# Altium footprint library 4.49-接插件.PcbLib: 260 footprints (part 11 of 17)
Each footprint in its own frame and in the unit in brackets; x right, y up, seen from the top. Pads: shape width x height; smd on the part's side, far side on the other; paste and mask are expansions set on the pad; w line width, h text height; cw(c..) or ccw(c..) is an arc to the next point about the centre after c.
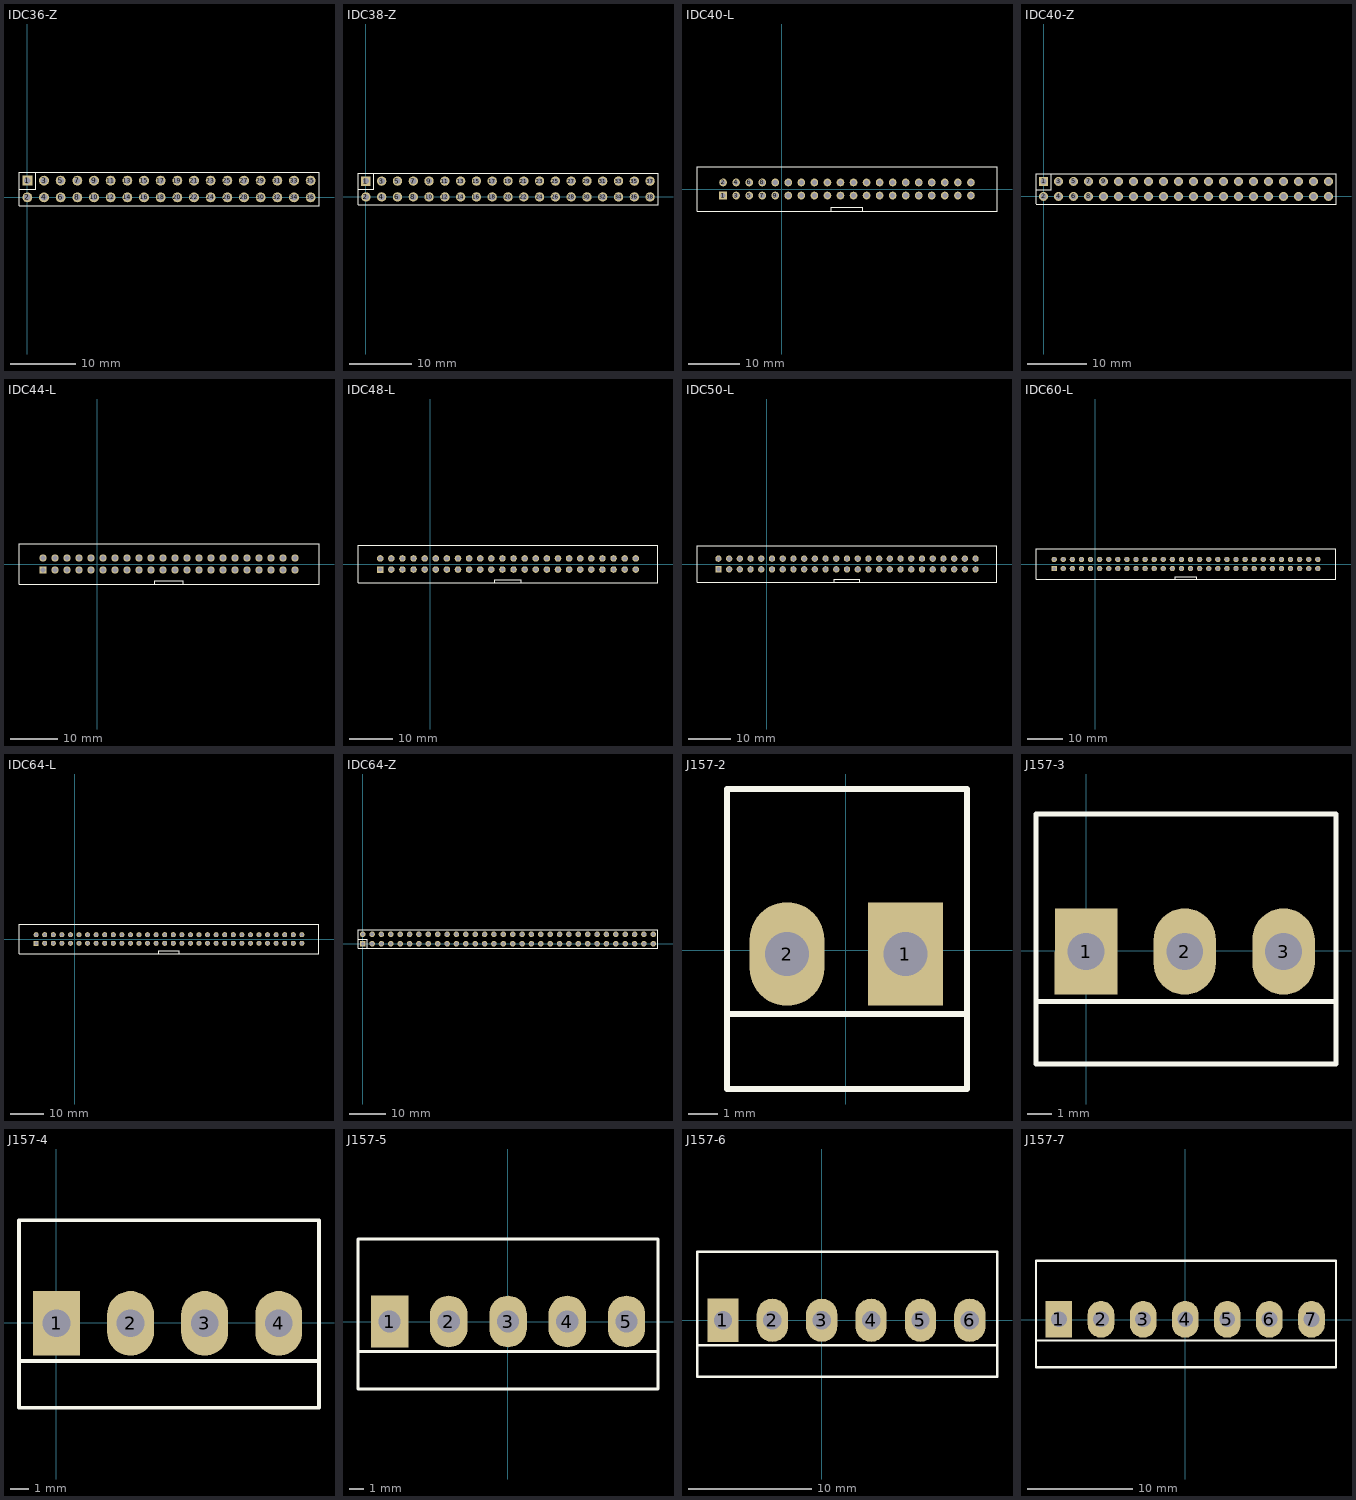
[diagram p10: the footprints below, top view; thin cyan lines are the x and y axes]

## IDC36-Z [mm]
pads (36):
  rect 1.5x1.5 hole 1: 1(0,2.54)
  round 1.5 hole 1: 2(0,0) 3(2.54,2.54) 4(2.54,0) 5(5.08,2.54) 6(5.08,0) 7(7.62,2.54) 8(7.62,0) 9(10.16,2.54) 10(10.16,0) 11(12.7,2.54) 12(12.7,0) 13(15.24,2.54) 14(15.24,0) 15(17.78,2.54) 16(17.78,0) 17(20.32,2.54) 18(20.32,0) 19(22.86,2.54) 20(22.86,0) 21(25.4,2.54) 22(25.4,0) 23(27.94,2.54) 24(27.94,0) 25(30.48,2.54) 26(30.48,0) 27(33.02,2.54) 28(33.02,0) 29(35.56,2.54) 30(35.56,0) 31(38.1,2.54) 32(38.1,0) 33(40.64,2.54) 34(40.64,0) 35(43.18,2.54) 36(43.18,0)
Top Overlay:
  lines w0.15: -1.27,1.27 1.27,1.27 1.27,3.81 ; -1.27,-1.27 44.45,-1.27 44.45,3.81 -1.27,3.81 -1.27,-1.27
3D body: height 8.5, standoff -3.35, extent -1.27,-1.23 44.45,3.77

## IDC38-Z [mm]
pads (38):
  rect 1.5x1.5 hole 1: 1(0,2.54)
  round 1.5 hole 1: 2(0,0) 3(2.54,2.54) 4(2.54,0) 5(5.08,2.54) 6(5.08,0) 7(7.62,2.54) 8(7.62,0) 9(10.16,2.54) 10(10.16,0) 11(12.7,2.54) 12(12.7,0) 13(15.24,2.54) 14(15.24,0) 15(17.78,2.54) 16(17.78,0) 17(20.32,2.54) 18(20.32,0) 19(22.86,2.54) 20(22.86,0) 21(25.4,2.54) 22(25.4,0) 23(27.94,2.54) 24(27.94,0) 25(30.48,2.54) 26(30.48,0) 27(33.02,2.54) 28(33.02,0) 29(35.56,2.54) 30(35.56,0) 31(38.1,2.54) 32(38.1,0) 33(40.64,2.54) 34(40.64,0) 35(43.18,2.54) 36(43.18,0) 37(45.72,2.54) 38(45.72,0)
Top Overlay:
  lines w0.15: -1.27,1.27 1.27,1.27 1.27,3.81 ; -1.27,-1.27 46.99,-1.27 46.99,3.81 -1.27,3.81 -1.27,-1.27
3D body: height 8.5, standoff -3.35, extent -1.27,-1.23 46.99,3.77

## IDC40-L [mm]
pads (40):
  rect 1.5x1.5 hole 1: 1(-11.43,-1.27)
  round 1.5 hole 1: 2(-11.43,1.27) 3(-8.89,-1.27) 4(-8.89,1.27) 5(-6.35,-1.27) 6(-6.35,1.27) 7(-3.81,-1.27) 8(-3.81,1.27) 9(-1.27,-1.27) 10(-1.27,1.27) 11(1.27,-1.27) 12(1.27,1.27) 13(3.81,-1.27) 14(3.81,1.27) 15(6.35,-1.27) 16(6.35,1.27) 17(8.89,-1.27) 18(8.89,1.27) 19(11.43,-1.27) 20(11.43,1.27) 21(13.97,-1.27) 22(13.97,1.27) 23(16.51,-1.27) 24(16.51,1.27) 25(19.05,-1.27) 26(19.05,1.27) 27(21.59,-1.27) 28(21.59,1.27) 29(24.13,-1.27) 30(24.13,1.27) 31(26.67,-1.27) 32(26.67,1.27) 33(29.21,-1.27) 34(29.21,1.27) 35(31.75,-1.27) 36(31.75,1.27) 37(34.29,-1.27) 38(34.29,1.27) 39(36.83,-1.27) 40(36.83,1.27)
Top Overlay:
  lines w0.15: 9.652,-4.318 9.652,-3.556 15.748,-3.556 15.748,-4.318 ; -16.51,-4.318 -16.51,4.318 41.91,4.318 41.91,-4.318 -16.51,-4.318
3D body: height 9.1, standoff -3.2, extent -16.51,-4.455 41.95,4.455

## IDC40-Z [mm]
pads (40):
  rect 1.5x1.5 hole 1: 1(0,2.54)
  round 1.5 hole 1: 2(0,0) 3(2.54,2.54) 4(2.54,0) 5(5.08,2.54) 6(5.08,0) 7(7.62,2.54) 8(7.62,0) 9(10.16,2.54) 10(10.16,0) 11(12.7,2.54) 12(12.7,0) 13(15.24,2.54) 14(15.24,0) 15(17.78,2.54) 16(17.78,0) 17(20.32,2.54) 18(20.32,0) 19(22.86,2.54) 20(22.86,0) 21(25.4,2.54) 22(25.4,0) 23(27.94,2.54) 24(27.94,0) 25(30.48,2.54) 26(30.48,0) 27(33.02,2.54) 28(33.02,0) 29(35.56,2.54) 30(35.56,0) 31(38.1,2.54) 32(38.1,0) 33(40.64,2.54) 34(40.64,0) 35(43.18,2.54) 36(43.18,0) 37(45.72,2.54) 38(45.72,0) 39(48.26,2.54) 40(48.26,0)
Top Overlay:
  lines w0.15: -1.27,-1.348 49.53,-1.348 49.53,3.838 -1.27,3.838 -1.27,-1.27 ; -1.247,1.166 -1.247,3.861 1.295,3.861 1.295,1.143 -1.245,1.168
3D body: height 8.5, standoff -3.35, extent -1.27,-1.205 49.53,3.795

## IDC44-L [mm]
pads (44):
  rect 1.5x1.5 hole 1: 1(-11.43,-1.27)
  round 1.5 hole 1: 2(-11.43,1.27) 3(-8.89,-1.27) 4(-8.89,1.27) 5(-6.35,-1.27) 6(-6.35,1.27) 7(-3.81,-1.27) 8(-3.81,1.27) 9(-1.27,-1.27) 10(-1.27,1.27) 11(1.27,-1.27) 12(1.27,1.27) 13(3.81,-1.27) 14(3.81,1.27) 15(6.35,-1.27) 16(6.35,1.27) 17(8.89,-1.27) 18(8.89,1.27) 19(11.43,-1.27) 20(11.43,1.27) 21(13.97,-1.27) 22(13.97,1.27) 23(16.51,-1.27) 24(16.51,1.27) 25(19.05,-1.27) 26(19.05,1.27) 27(21.59,-1.27) 28(21.59,1.27) 29(24.13,-1.27) 30(24.13,1.27) 31(26.67,-1.27) 32(26.67,1.27) 33(29.21,-1.27) 34(29.21,1.27) 35(31.75,-1.27) 36(31.75,1.27) 37(34.29,-1.27) 38(34.29,1.27) 39(36.83,-1.27) 40(36.83,1.27) 41(39.37,-1.27) 42(39.37,1.27) 43(41.91,-1.27) 44(41.91,1.27)
Top Overlay:
  lines w0.15: 12.192,-4.318 12.192,-3.556 18.288,-3.556 18.288,-4.318 ; -16.51,-4.318 -16.51,4.318 46.99,4.318 46.99,-4.318 -16.51,-4.318
3D body: height 9.1, standoff -3.2, extent -16.51,-4.455 47.03,4.455

## IDC48-L [mm]
pads (48):
  rect 1.5x1.5 hole 1: 1(-11.43,-1.27)
  round 1.5 hole 1: 2(-11.43,1.27) 3(-8.89,-1.27) 4(-8.89,1.27) 5(-6.35,-1.27) 6(-6.35,1.27) 7(-3.81,-1.27) 8(-3.81,1.27) 9(-1.27,-1.27) 10(-1.27,1.27) 11(1.27,-1.27) 12(1.27,1.27) 13(3.81,-1.27) 14(3.81,1.27) 15(6.35,-1.27) 16(6.35,1.27) 17(8.89,-1.27) 18(8.89,1.27) 19(11.43,-1.27) 20(11.43,1.27) 21(13.97,-1.27) 22(13.97,1.27) 23(16.51,-1.27) 24(16.51,1.27) 25(19.05,-1.27) 26(19.05,1.27) 27(21.59,-1.27) 28(21.59,1.27) 29(24.13,-1.27) 30(24.13,1.27) 31(26.67,-1.27) 32(26.67,1.27) 33(29.21,-1.27) 34(29.21,1.27) 35(31.75,-1.27) 36(31.75,1.27) 37(34.29,-1.27) 38(34.29,1.27) 39(36.83,-1.27) 40(36.83,1.27) 41(39.37,-1.27) 42(39.37,1.27) 43(41.91,-1.27) 44(41.91,1.27) 45(44.45,-1.27) 46(44.45,1.27) 47(46.99,-1.27) 48(46.99,1.27)
Top Overlay:
  lines w0.15: 14.732,-4.318 14.732,-3.556 20.828,-3.556 20.828,-4.318 ; -16.51,-4.318 52.07,-4.318 52.07,4.318 -16.51,4.318 -16.51,-4.318
3D body: height 9.1, standoff -3.2, extent -16.51,-4.455 52.11,4.455

## IDC50-L [mm]
pads (50):
  rect 1.5x1.5 hole 1: 1(-11.43,-1.27)
  round 1.5 hole 1: 2(-11.43,1.27) 3(-8.89,-1.27) 4(-8.89,1.27) 5(-6.35,-1.27) 6(-6.35,1.27) 7(-3.81,-1.27) 8(-3.81,1.27) 9(-1.27,-1.27) 10(-1.27,1.27) 11(1.27,-1.27) 12(1.27,1.27) 13(3.81,-1.27) 14(3.81,1.27) 15(6.35,-1.27) 16(6.35,1.27) 17(8.89,-1.27) 18(8.89,1.27) 19(11.43,-1.27) 20(11.43,1.27) 21(13.97,-1.27) 22(13.97,1.27) 23(16.51,-1.27) 24(16.51,1.27) 25(19.05,-1.27) 26(19.05,1.27) 27(21.59,-1.27) 28(21.59,1.27) 29(24.13,-1.27) 30(24.13,1.27) 31(26.67,-1.27) 32(26.67,1.27) 33(29.21,-1.27) 34(29.21,1.27) 35(31.75,-1.27) 36(31.75,1.27) 37(34.29,-1.27) 38(34.29,1.27) 39(36.83,-1.27) 40(36.83,1.27) 41(39.37,-1.27) 42(39.37,1.27) 43(41.91,-1.27) 44(41.91,1.27) 45(44.45,-1.27) 46(44.45,1.27) 47(46.99,-1.27) 48(46.99,1.27) 49(49.53,-1.27) 50(49.53,1.27)
Top Overlay:
  lines w0.15: 16.002,-4.318 16.002,-3.556 22.098,-3.556 22.098,-4.318 ; -16.51,-4.318 54.61,-4.318 54.61,4.318 -16.51,4.318 -16.51,-4.318
3D body: height 9.1, standoff -3.2, extent -16.51,-4.555 54.65,4.555

## IDC60-L [mm]
pads (60):
  rect 1.5x1.5 hole 1: 1(-11.43,-1.27)
  round 1.5 hole 1: 2(-11.43,1.27) 3(-8.89,-1.27) 4(-8.89,1.27) 5(-6.35,-1.27) 6(-6.35,1.27) 7(-3.81,-1.27) 8(-3.81,1.27) 9(-1.27,-1.27) 10(-1.27,1.27) 11(1.27,-1.27) 12(1.27,1.27) 13(3.81,-1.27) 14(3.81,1.27) 15(6.35,-1.27) 16(6.35,1.27) 17(8.89,-1.27) 18(8.89,1.27) 19(11.43,-1.27) 20(11.43,1.27) 21(13.97,-1.27) 22(13.97,1.27) 23(16.51,-1.27) 24(16.51,1.27) 25(19.05,-1.27) 26(19.05,1.27) 27(21.59,-1.27) 28(21.59,1.27) 29(24.13,-1.27) 30(24.13,1.27) 31(26.67,-1.27) 32(26.67,1.27) 33(29.21,-1.27) 34(29.21,1.27) 35(31.75,-1.27) 36(31.75,1.27) 37(34.29,-1.27) 38(34.29,1.27) 39(36.83,-1.27) 40(36.83,1.27) 41(39.37,-1.27) 42(39.37,1.27) 43(41.91,-1.27) 44(41.91,1.27) 45(44.45,-1.27) 46(44.45,1.27) 47(46.99,-1.27) 48(46.99,1.27) 49(49.53,-1.27) 50(49.53,1.27) 51(52.07,-1.27) 52(52.07,1.27) 53(54.61,-1.27) 54(54.61,1.27) 55(57.15,-1.27) 56(57.15,1.27) 57(59.69,-1.27) 58(59.69,1.27) 59(62.23,-1.27) 60(62.23,1.27)
Top Overlay:
  lines w0.15: 22.352,-4.318 22.352,-3.556 28.448,-3.556 28.448,-4.318 ; -16.51,-4.318 -16.51,4.318 67.31,4.318 67.31,-4.318 -16.51,-4.318
3D body: height 9.1, standoff -3.2, extent -16.51,-4.455 67.35,4.455

## IDC64-L [mm]
pads (64):
  rect 1.5x1.5 hole 1: 1(-11.43,-1.27)
  round 1.5 hole 1: 2(-11.43,1.27) 3(-8.89,-1.27) 4(-8.89,1.27) 5(-6.35,-1.27) 6(-6.35,1.27) 7(-3.81,-1.27) 8(-3.81,1.27) 9(-1.27,-1.27) 10(-1.27,1.27) 11(1.27,-1.27) 12(1.27,1.27) 13(3.81,-1.27) 14(3.81,1.27) 15(6.35,-1.27) 16(6.35,1.27) 17(8.89,-1.27) 18(8.89,1.27) 19(11.43,-1.27) 20(11.43,1.27) 21(13.97,-1.27) 22(13.97,1.27) 23(16.51,-1.27) 24(16.51,1.27) 25(19.05,-1.27) 26(19.05,1.27) 27(21.59,-1.27) 28(21.59,1.27) 29(24.13,-1.27) 30(24.13,1.27) 31(26.67,-1.27) 32(26.67,1.27) 33(29.21,-1.27) 34(29.21,1.27) 35(31.75,-1.27) 36(31.75,1.27) 37(34.29,-1.27) 38(34.29,1.27) 39(36.83,-1.27) 40(36.83,1.27) 41(39.37,-1.27) 42(39.37,1.27) 43(41.91,-1.27) 44(41.91,1.27) 45(44.45,-1.27) 46(44.45,1.27) 47(46.99,-1.27) 48(46.99,1.27) 49(49.53,-1.27) 50(49.53,1.27) 51(52.07,-1.27) 52(52.07,1.27) 53(54.61,-1.27) 54(54.61,1.27) 55(57.15,-1.27) 56(57.15,1.27) 57(59.69,-1.27) 58(59.69,1.27) 59(62.23,-1.27) 60(62.23,1.27) 61(64.77,-1.27) 62(64.77,1.27) 63(67.31,-1.27) 64(67.31,1.27)
Top Overlay:
  lines w0.15: 24.892,-4.318 24.892,-3.556 30.988,-3.556 30.988,-4.318 ; -16.51,-4.318 72.39,-4.318 72.39,4.318 -16.51,4.318 -16.51,-4.318
3D body: height 9.1, standoff -3.2, extent -16.51,-4.455 72.43,4.455

## IDC64-Z [mm]
pads (64):
  rect 1.5x1.5 hole 1: 1(0,0)
  round 1.5 hole 1: 2(0,2.54) 3(2.54,0) 4(2.54,2.54) 5(5.08,0) 6(5.08,2.54) 7(7.62,0) 8(7.62,2.54) 9(10.16,0) 10(10.16,2.54) 11(12.7,0) 12(12.7,2.54) 13(15.24,0) 14(15.24,2.54) 15(17.78,0) 16(17.78,2.54) 17(20.32,0) 18(20.32,2.54) 19(22.86,0) 20(22.86,2.54) 21(25.4,0) 22(25.4,2.54) 23(27.94,0) 24(27.94,2.54) 25(30.48,0) 26(30.48,2.54) 27(33.02,0) 28(33.02,2.54) 29(35.56,0) 30(35.56,2.54) 31(38.1,0) 32(38.1,2.54) 33(40.64,0) 34(40.64,2.54) 35(43.18,0) 36(43.18,2.54) 37(45.72,0) 38(45.72,2.54) 39(48.26,0) 40(48.26,2.54) 41(50.8,0) 42(50.8,2.54) 43(53.34,0) 44(53.34,2.54) 45(55.88,0) 46(55.88,2.54) 47(58.42,0) 48(58.42,2.54) 49(60.96,0) 50(60.96,2.54) 51(63.5,0) 52(63.5,2.54) 53(66.04,0) 54(66.04,2.54) 55(68.58,0) 56(68.58,2.54) 57(71.12,0) 58(71.12,2.54) 59(73.66,0) 60(73.66,2.54) 61(76.2,0) 62(76.2,2.54) 63(78.74,0) 64(78.74,2.54)
Top Overlay:
  lines w0.15: -1.27,1.27 1.27,1.27 1.27,-1.27 ; -1.27,-1.27 80.01,-1.27 80.01,3.81 -1.27,3.81 -1.27,-1.27
3D body: height 8, standoff -3.2, extent -1.52,-1.27 80.26,3.81

## J157-2 [mil]
pads (2):
  rect 100x138 hole 59: 1(80,-5.21)
  oval 100x138 hole 59: 2(-78,-5.21)
Top Overlay:
  lines w8: -158,-85.21 162,-85.21 ; -158,-185.21 162,-185.21 162,214.79 -158,214.79 -158,-185.21
3D body: height 585, standoff -135, extent -149,-200 157,194

## J157-3 [mil]
pads (3):
  rect 100x138 hole 59: 1(0,-1.21)
  oval 100x138 hole 59: 2(158,-1.21) 3(316,-1.21)
Top Overlay:
  lines w8: -80,-81.21 400,-81.21 ; -80,-181.21 400,-181.21 400,218.79 -80,218.79 -80,-181.21
3D body: height 585, standoff -135, extent -71,-196 391,198

## J157-4 [mil]
pads (4):
  rect 100x138 hole 59: 1(1,-1.21)
  oval 100x138 hole 59: 2(159,-1.21) 3(317,-1.21) 4(475,-1.21)
Top Overlay:
  lines w8: -79,-81.21 561,-81.21 ; -79,-181.21 -79,218.79 561,218.79 561,-181.21 -79,-181.21
3D body: height 585, standoff -135, extent -69,-196 549,198

## J157-5 [mil]
pads (5):
  rect 100x138 hole 59: 1(-315,0.79)
  oval 100x138 hole 59: 2(-157,0.79) 3(1,0.79) 4(159,0.79) 5(317,0.79)
Top Overlay:
  lines w8: -399,-79.21 401,-79.21 ; -399,-179.21 -399,220.79 401,220.79 401,-179.21 -399,-179.21
3D body: height 585, standoff -135, extent -385,-192 389,202

## J157-6 [mil]
pads (6):
  rect 100x138 hole 59: 1(-316,-0.07)
  oval 100x138 hole 59: 2(-158,-0.07) 3(0,-0.07) 4(158,-0.07) 5(316,-0.07) 6(474,-0.07)
Top Overlay:
  lines w8: -399.14,-80.07 560.86,-80.07 ; -399.14,-180.07 -399.14,219.93 560.86,219.93 560.86,-180.07 -399.14,-180.07
3D body: height 575, standoff -145, extent -387,-194 543,200

## J157-7 [mil]
pads (7):
  rect 100x138 hole 59: 1(-474,0.79)
  oval 100x138 hole 59: 2(-316,0.79) 3(-158,0.79) 4(0,0.79) 5(158,0.79) 6(316,0.79) 7(474,0.79)
Top Overlay:
  lines w8: -560,-79.21 566,-79.21 ; -560,-179.21 566,-179.21 566,220.79 -560,220.79 -560,-179.21
3D body: height 424.33, standoff -144.57, extent -544.49,-148.65 544.49,186